# Altium footprint library Connector.PcbLib: 231 footprints (part 7 of 15)
Each footprint in its own frame and in the unit in brackets; x right, y up, seen from the top. Pads: shape width x height; smd on the part's side, far side on the other; paste and mask are expansions set on the pad; w line width, h text height; cw(c..) or ccw(c..) is an arc to the next point about the centre after c.
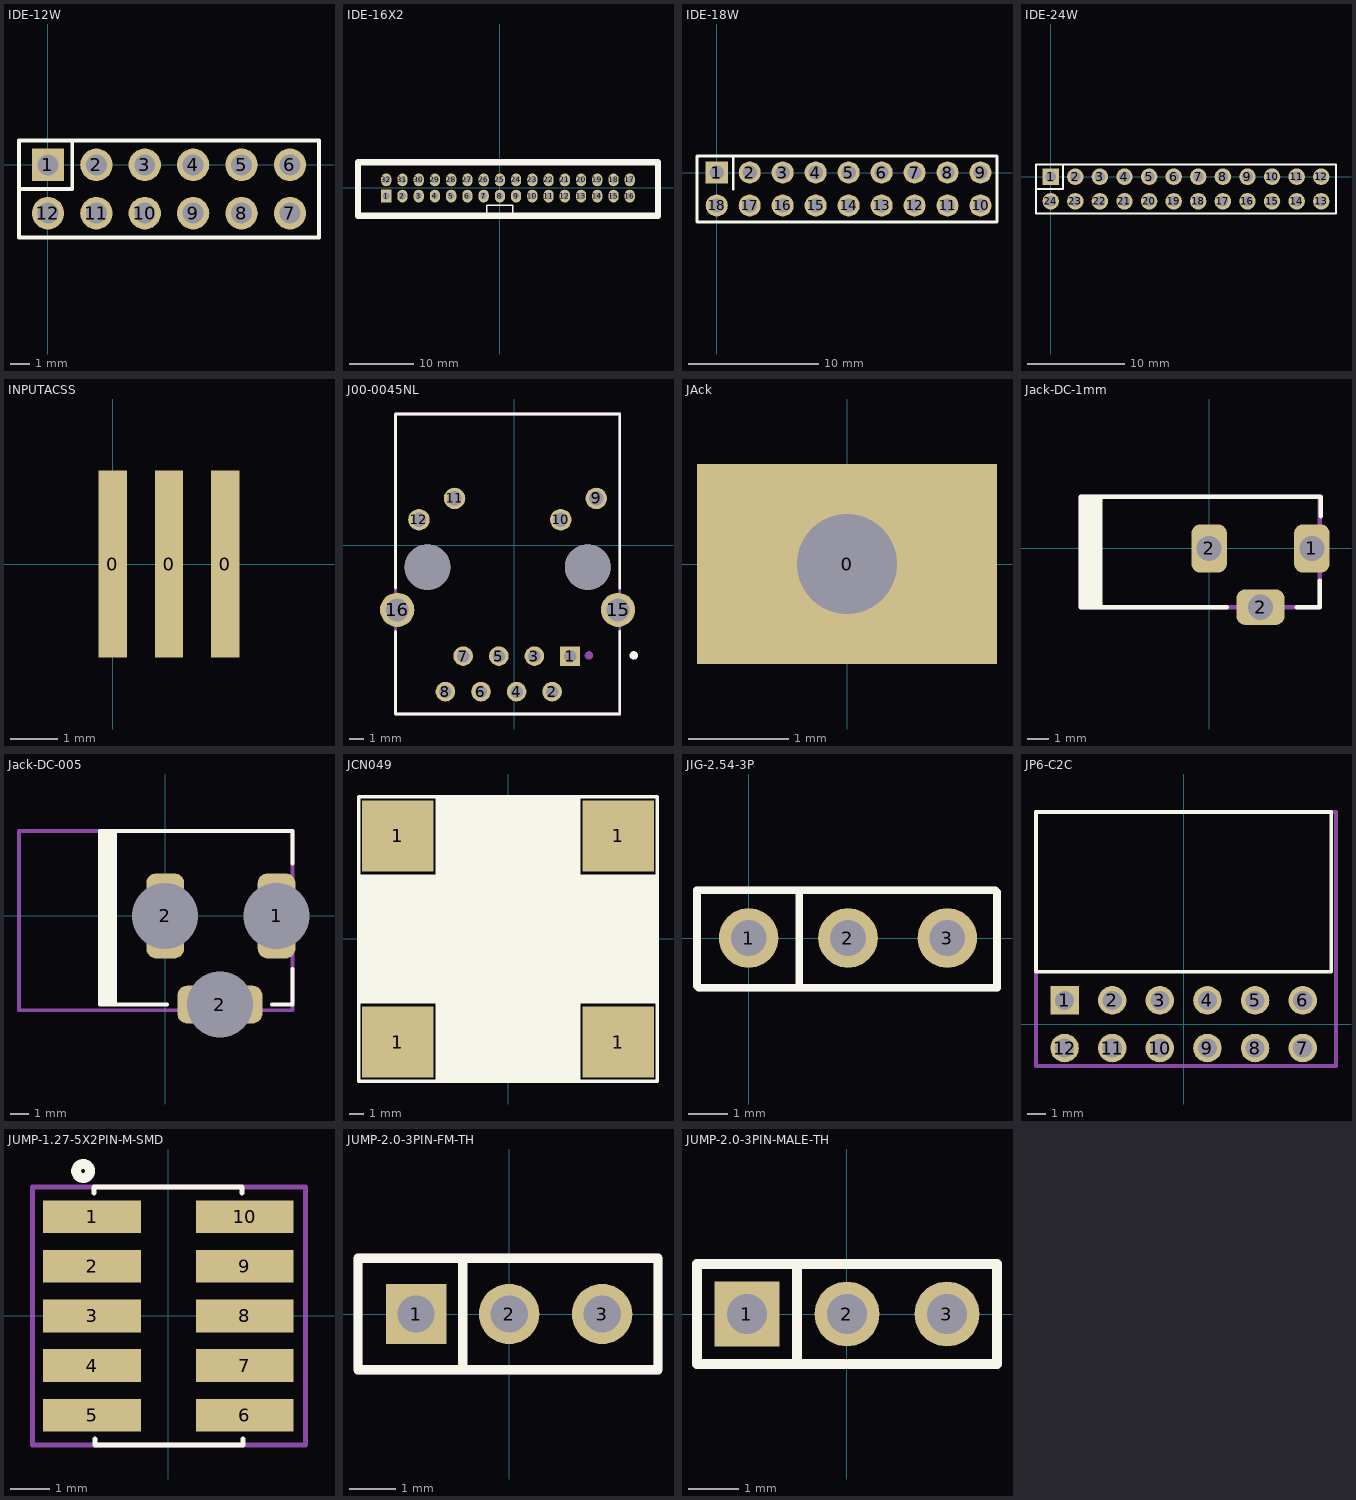
[diagram p6: the footprints below, top view; thin cyan lines are the x and y axes]

## IDE-12W [mm]
pads (12):
  rect 1.7x1.7 hole 1.1: 1(0,0)
  round 1.7 hole 1.1: 2(2.54,0) 3(5.08,0) 4(7.62,0) 5(10.16,0) 6(12.7,0) 7(12.7,-2.54) 8(10.16,-2.54) 9(7.62,-2.54) 10(5.08,-2.54) 11(2.54,-2.54) 12(0,-2.54)
Top Overlay:
  lines w0.2: 1.27,1.27 1.27,-1.27 -1.52,-1.27 ; -1.52,-1.27 -1.52,-1.295 -1.52,-1.27 ; -1.52,-3.81 14.224,-3.81 14.224,1.27 -1.52,1.27 -1.52,-3.81
3D body "IDC12 3D.step": height 9.2, standoff -3.1, extent -7.595,-2.798 20.345,10.492

## IDE-16X2 [mm]
pads (32):
  rect 1.6x2 hole 1.1: 1(-17.78,-1.27)
  oval 1.6x2 hole 1.1: 2(-15.24,-1.27) 3(-12.7,-1.27) 4(-10.16,-1.27) 5(-7.62,-1.27) 6(-5.08,-1.27) 7(-2.54,-1.27) 8(0,-1.27) 9(2.54,-1.27) 10(5.08,-1.27) 11(7.62,-1.27) 12(10.16,-1.27) 13(12.7,-1.27) 14(15.24,-1.27) 15(17.78,-1.27) 16(20.32,-1.27) 17(20.32,1.27) 18(17.78,1.27) 19(15.24,1.27) 20(12.7,1.27) 21(10.16,1.27) 22(7.62,1.27) 23(5.08,1.27) 24(2.54,1.27) 25(0,1.27) 26(-2.54,1.27) 27(-5.08,1.27) 28(-7.62,1.27) 29(-10.16,1.27) 30(-12.7,1.27) 31(-15.24,1.27) 32(-17.78,1.27)
Top Overlay:
  lines w0.254: -2.032,-4.224 -2.032,-2.7 2.032,-2.7 2.032,-3.97
  lines w1: -1.88,-4.318 24.74,-4.318 24.74,4 -1.88,4 ; 4.42,-4.318 -22.2,-4.318 -22.2,4 4.42,4
Mechanical 13:
  text ".Designator" at -3.81,-0.762 h2
Mechanical 15:
  text ".Comment" at -3.81,-0.508 h2
3D body "User Library-HDB-20.step": height 9.3, standoff -2.5, extent -7.7,-4.7 25.2,4.7
3D body "User Library-HDB-20.step": height 9.3, standoff -2.5, extent -22.6,-4.7 10.3,4.7

## IDE-18W [mm]
pads (18):
  rect 1.7x1.7 hole 1.1: 1(0,0)
  round 1.7 hole 1.1: 2(2.54,0) 3(5.08,0) 4(7.62,0) 5(10.16,0) 6(12.7,0) 7(15.24,0) 8(17.78,0) 9(20.32,0) 10(20.32,-2.54) 11(17.78,-2.54) 12(15.24,-2.54) 13(12.7,-2.54) 14(10.16,-2.54) 15(7.62,-2.54) 16(5.08,-2.54) 17(2.54,-2.54) 18(0,-2.54)
Top Overlay:
  lines w0.2: 1.27,-1.27 1.27,1.27 ; -1.52,-3.81 21.59,-3.81 21.59,1.27 -1.52,1.27 -1.52,-3.81

## IDE-24W [mm]
pads (24):
  rect 1.7x1.7 hole 1.1: 1(0,0)
  round 1.7 hole 1.1: 2(2.54,0) 3(5.08,0) 4(7.62,0) 5(10.16,0) 6(12.7,0) 7(15.24,0) 8(17.78,0) 9(20.32,0) 10(22.86,0) 11(25.4,0) 12(27.94,0) 13(27.94,-2.54) 14(25.4,-2.54) 15(22.86,-2.54) 16(20.32,-2.54) 17(17.78,-2.54) 18(15.24,-2.54) 19(12.7,-2.54) 20(10.16,-2.54) 21(7.62,-2.54) 22(5.08,-2.54) 23(2.54,-2.54) 24(0,-2.54)
Top Overlay:
  lines w0.2: -1.52,-1.27 1.27,-1.27 1.27,1.27 ; -1.52,-3.81 -1.52,1.27 29.464,1.27 29.464,-3.81 -1.52,-3.81
3D body "IDC24 3D.step": height 9.21, standoff -3, extent -5.07,-2.88 33.01,9.64

## IDE_8 [mm]

## INPUTACSS [mm]
pads (3):
  rect 0.6x4 smd: 0(0,0) 0(1.2,0) 0(2.4,0)

## J00-0045NL [mm]
pads (16):
  rect 1.398x1.398 hole 0.89: 1(3.961,-7.922)
  round 1.398 hole 0.89: 2(2.691,-10.462) 3(1.421,-7.922) 4(0.151,-10.462) 5(-1.119,-7.922) 6(-2.389,-10.462) 7(-3.659,-7.922) 8(-4.929,-10.462)
  round 1.53 hole 1.02: 9(5.836,3.328) 10(3.296,1.808) 11(-4.274,3.328) 12(-6.814,1.808)
  round 2.445 hole 1.63: 15(7.386,-4.622) 16(-8.364,-4.622)
  round 3.25 hole 3.25 unplated: ""(-6.204,-1.572) ""(5.226,-1.572)
Top Overlay:
  circle w0.3: c8.511,-7.872 r0.15
  lines w0.2: -8.489,-6.172 -8.489,-12.052 7.511,-12.052 7.511,-6.172 ; -8.489,-3.072 -8.489,9.348 7.511,9.348 7.511,-3.072
Mechanical 13:
  circle w0.3: c5.311,-7.872 r0.15
  lines w0.2: -8.489,-12.052 -8.489,9.348 7.511,9.348 7.511,-12.052 -8.489,-12.052
  text ".Designator" at 0.38,-6.072 h3
Mechanical 15:
  text ".Comment" at 0.33,-6.472 h3
3D body "step_temp.STEP": height 13.5, standoff -3.05, extent -8.489,-12.222 7.551,9.078

## JAck [mm]
pads (1):
  rect 3x2 hole 1 square: 0(0,0)

## Jack-DC-1mm [mm]
pads (3):
  rrect50% 1.7x2.3 hole 1.2 square: 1(4.9,0) 2(0,0)
  rrect50% 2.3x1.7 hole 1.2 square: 2(2.45,-2.8)
Top Overlay:
  region: -6.148,2.47 -6.148,-2.8 -5.097,-2.8 -5.097,2.47
  lines w0.2: 0.85,-2.8 -6.125,-2.8 -6.125,2.47 5.325,2.47 5.325,1.533 ; 4.174,-2.8 5.275,-2.8 5.275,-1.524
Mechanical 13:
  lines w0.2: -6.125,-2.8 -6.125,2.47 5.275,2.47 5.275,-2.8 -6.125,-2.8
  text ".Designator" at -4.9,-1.791 h1.5
3D body "dc-002-2a-10.stp": height 7.7, standoff -2.9, extent -6.125,-2.8 5.275,2.55

## Jack-DC-005 [mm]
pads (3):
  rrect50% 2x4.5 hole 3.5 square: 1(5.9,0) 2(0,0)
  rrect50% 4.5x2 hole 3.5 square: 2(2.9,-4.7)
Top Overlay:
  region: -3.453,4.489 -3.453,-4.711 -2.543,-4.711 -2.543,4.489
  lines w0.2: 0.097,-4.7 -3.453,-4.7 -3.453,4.5 6.75,4.5 6.75,2.783 ; 5.649,-4.7 6.75,-4.7 6.75,-2.8
Mechanical 13:
  lines w0.2: -7.75,-5 6.75,-5 6.75,4.5 -7.75,4.5 -7.75,-5
  text ".Designator" at -4.9,-1.791 h1.5
3D body "694106301002.stp": height 10.85, standoff -3.65, extent -7.75,-5 6.75,4.5

## JCN049 [mm]
pads (4):
  rect 5x5 smd paste-5.08: 1(-7.747,-7.239) 1(-7.747,7.239) 1(7.747,-7.239) 1(7.747,7.239)
Top Overlay:
  region: -10.541,4.5 -5.08,4.5 -5.08,10.033 5.08,10.033 5.08,4.5 10.541,4.5 10.541,-4.5 5.08,-4.5 5.08,-10.033 -5.08,-10.033 -5.08,-4.5 -10.541,-4.5
  lines w0.254: -10.5,-10 10.5,-10 10.5,10 -10.5,10 -10.5,-10

## JIG-2.54-3P [mil]
pads (3):
  round 60 hole 35.83 mask+4: 1(0,0) 2(100,0) 3(200,0)
Top Overlay:
  lines w7.87: 51,-50 51,48 ; -52,-48 -52,48 248,48 250,46 250,-50 -50,-50 -52,-48
Mechanical 13:
  lines w7.87: -52,-48 -52,48 248,48 250,46 250,-50 -50,-50 -52,-48
  text ".Designator" at -45,-19 h59.06

## JP6-C2C [mm] "12p 2 rows Right angle"
height 5.08
pads (12):
  rect 1.52x1.52 hole 1.02: 1(-6.35,1.27)
  round 1.52 hole 1.02: 2(-3.81,1.27) 3(-1.27,1.27) 4(1.27,1.27) 5(3.81,1.27) 6(6.35,1.27) 7(6.35,-1.27) 8(3.81,-1.27) 9(1.27,-1.27) 10(-1.27,-1.27) 11(-3.81,-1.27) 12(-6.35,-1.27)
Top Overlay:
  lines w0.2: -7.874,2.794 7.874,2.794 7.874,11.316 -7.874,11.316 -7.874,2.794
Mechanical 13:
  lines w0.2: -7.874,-2.23 -7.874,11.316 8.124,11.316 8.124,-2.23 -7.874,-2.23
  text ".Designator" at -3.6,-0.6 h2
3D body "613012243121.stp": height 5.09, standoff -4.46, extent -7.87,-1.478 7.87,11.362

## JUMP-1.27-5X2PIN-M-SMD [mm]
pads (10):
  rect 2.5x0.838 smd: 1(-1.955,2.54) 2(-1.955,1.27) 3(-1.955,0) 4(-1.955,-1.27) 5(-1.955,-2.54) 6(1.955,-2.54) 7(1.955,-1.27) 8(1.955,0) 9(1.955,1.27) 10(1.955,2.54)
Top Overlay:
  circle w0.254: c-2.184,3.708 r0.18
  lines w0.127: -1.905,3.15 -1.905,3.302 1.88,3.302 1.88,3.15 ; -1.879,-3.15 -1.879,-3.302 1.906,-3.302 1.906,-3.15
Mechanical 13:
  lines w0.127: -3.479,-3.302 3.506,-3.302 3.506,3.302 3.379,3.302 -3.479,3.302 -3.479,-3.302
  text ".Designator" at -0.305,2.997 h1.5
Mechanical 15:
  lines w0.127: -3.479,-3.302 -3.479,3.302 3.506,3.302 3.506,-3.302 -3.479,-3.302
  text ".Comment" at -0.305,2.997 h1.5
3D body "60462.stp": height 4.7, standoff 0.02, extent -2.8,-3.175 2.7,3.175

## JUMP-2.0-3PIN-FM-TH [mm] "4 pins, 1 row, straight, gold plating"
height 6
pads (3):
  rect 1.3x1.3 hole 0.8: 1(-2,0)
  round 1.3 hole 0.8: 2(0,0) 3(2,0)
Top Overlay:
  lines w0.2: -1,-1.2 -1,1.2 ; -3.25,-1.2 -3.25,1.2 3.2,1.2 3.2,-1.2 -3.25,-1.2
Mechanical 13:
  lines w0.2: -3.25,-1.2 3.2,-1.2 3.2,1.2 -3.25,1.2 -3.25,-1.2
  text ".Designator" at -2.3,-0.4 h1.5
Mechanical 15:
  lines w0.2: -3.25,-1.2 3.2,-1.2 3.2,1.2 -3.25,1.2 -3.25,-1.2
  text ".Comment" at -2.3,-0.5 h1.5

## JUMP-2.0-3PIN-MALE-TH [mm] "4 pins, 1 row, straight, gold plating"
height 6
pads (3):
  rect 1.3x1.3 hole 0.8: 1(-2,0)
  round 1.3 hole 0.8: 2(0,0) 3(2,0)
Top Overlay:
  lines w0.2: -1,-1 -1,1 ; -3,-1 3,-1 3,1 -3,1 -3,-1
Mechanical 13:
  lines w0.2: -3,-1 -3,1 3,1 3,-1 -3,-1
  text ".Designator" at -2.3,-0.4 h1.5
Mechanical 15:
  lines w0.2: -3,-1 -3,1 3,1 3,-1 -3,-1
  text ".Comment" at -2.1,-0.4 h1.5